# Altium footprint library PowerProducts.PCBLIB: 166 footprints (part 8 of 11)
Each footprint in its own frame and in the unit in brackets; x right, y up, seen from the top. Pads: shape width x height; smd on the part's side, far side on the other; paste and mask are expansions set on the pad; w line width, h text height; cw(c..) or ccw(c..) is an arc to the next point about the centre after c.
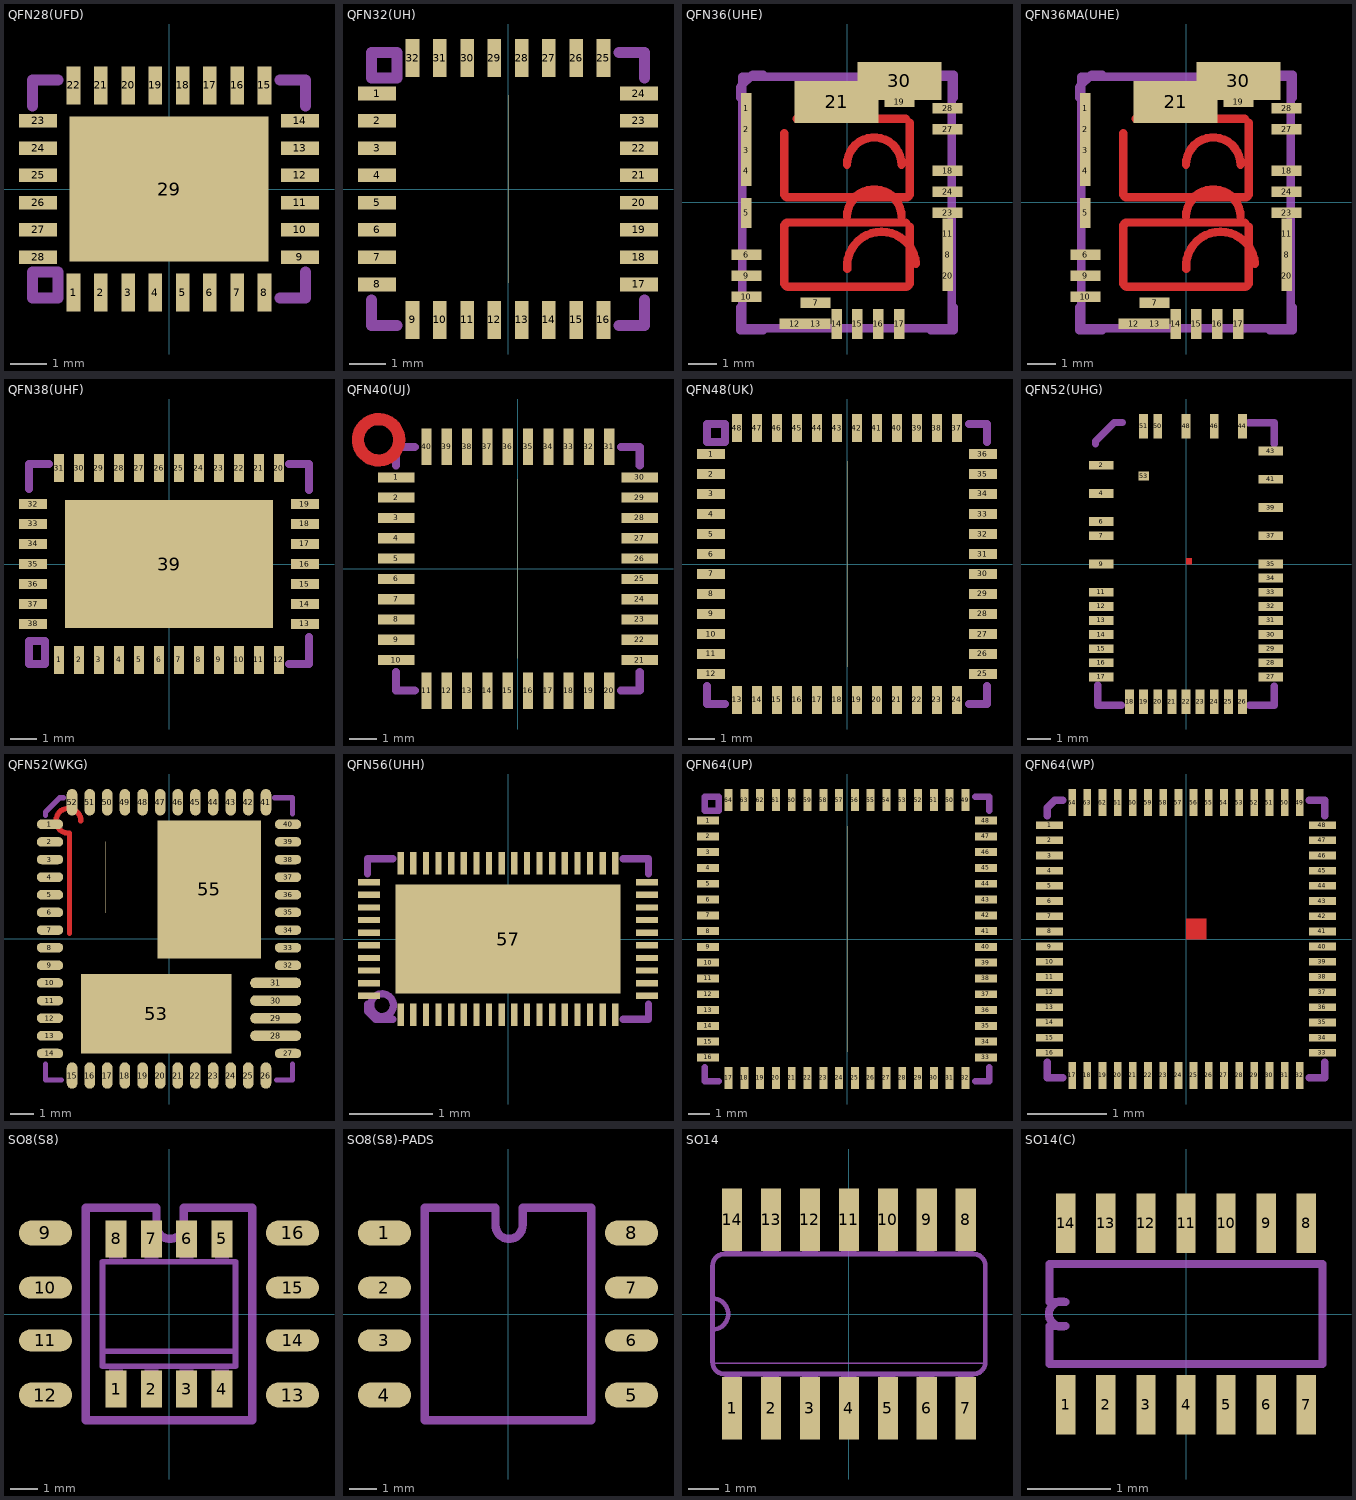
[diagram p7: the footprints below, top view; thin cyan lines are the x and y axes]

## QFN28(UFD) [mil]
pads (29):
  rect 14.76x41.34 smd: 1(-103.35,-112.2) 2(-73.82,-112.2) 3(-44.29,-112.2) 4(-14.76,-112.2) 5(14.76,-112.2) 6(44.29,-112.2) 7(73.82,-112.2) 8(103.35,-112.2) 15(103.35,112.2) 16(73.82,112.2) 17(44.29,112.2) 18(14.76,112.2) 19(-14.76,112.2) 20(-44.29,112.2) 21(-73.82,112.2) 22(-103.35,112.2)
  rect 41.34x14.76 smd: 9(141.73,-73.82) 10(141.73,-44.29) 11(141.73,-14.76) 12(141.73,14.76) 13(141.73,44.29) 14(141.73,73.82) 23(-141.73,73.82) 24(-141.73,44.29) 25(-141.73,14.76) 26(-141.73,-14.76) 27(-141.73,-44.29) 28(-141.73,-73.82)
  rect 215.55x156.5 smd: 29(0,0)
Mechanical 2:
  lines w12: -147.64,90 -147.64,118.11 -120,118.11 ; 120,-118.11 147.64,-118.11 147.64,-90 ; 120,118.11 147.64,118.11 147.64,90 ; -147.64,-118.11 -120,-118.11 -120,-90 -147.64,-90 -147.64,-118.11

## QFN32(UH) [mm]
pads (33):
  rect 1.05x0.375 smd: 1(-3.6,2.625) 2(-3.6,1.875) 3(-3.6,1.125) 4(-3.6,0.375) 5(-3.6,-0.375) 6(-3.6,-1.125) 7(-3.6,-1.875) 8(-3.6,-2.625) 17(3.6,-2.625) 18(3.6,-1.875) 19(3.6,-1.125) 20(3.6,-0.375) 21(3.6,0.375) 22(3.6,1.125) 23(3.6,1.875) 24(3.6,2.625)
  rect 0.375x1.05 smd: 9(-2.625,-3.6) 10(-1.875,-3.6) 11(-1.125,-3.6) 12(-0.375,-3.6) 13(0.375,-3.6) 14(1.125,-3.6) 15(1.875,-3.6) 16(2.625,-3.6) 25(2.625,3.6) 26(1.875,3.6) 27(1.125,3.6) 28(0.375,3.6) 29(-0.375,3.6) 30(-1.125,3.6) 31(-1.875,3.6) 32(-2.625,3.6)
  rect 0x5.175 smd: 33(0,0)
Mechanical 2:
  lines w0.305: -3.75,-3.048 -3.75,-3.75 -3.048,-3.75 ; 3.048,-3.75 3.75,-3.75 3.75,-3.048 ; 3.048,3.75 3.75,3.75 3.75,3.048 ; -3.75,3.048 -3.048,3.048 -3.048,3.75 -3.75,3.75 -3.75,3.048

## QFN36(UHE) [mm]
pads (26):
  rect 0.375x1.08 smd: 1(-3.6,3.375) 2(-3.6,2.625) 3(-3.6,1.875) 4(-3.6,1.125) 5(-3.6,-0.375) 8(3.6,-1.875) 11(3.6,-1.125) 14(-0.375,-4.35) 15(0.375,-4.35) 16(1.125,-4.35) 17(1.875,-4.35) 20(3.6,-2.625)
  rect 1.08x0.375 smd: 6(-3.6,-1.875) 7(-1.125,-3.6) 9(-3.6,-2.625) 10(-3.6,-3.375) 12(-1.875,-4.35) 13(-1.125,-4.35) 18(3.6,1.125) 19(1.875,3.6) 23(3.6,-0.375) 24(3.6,0.375) 27(3.6,2.625) 28(3.6,3.375)
  rect 3x1.5 smd: 21(-0.375,3.6)
  rect 3x1.35 smd: 30(1.875,4.35)
Top Layer:
  lines w0.3: -2.25,2.475 -2.25,0.33 ccw(c-2.1,0.33) -2.1,0.18 2.1,0.18 ccw(c2.1,0.33) 2.25,0.33 2.25,2.85 ; -1.8,3 2.1,3 ; 0,-0.51 cw(c0.975,-0.51) 1.95,-0.51 ; 0,1.351 cw(c0.975,1.351) 1.95,1.351 ; 0.003,-2.383 cw(c1.236,-2.288) 2.47,-2.193 ; 2.1,-0.72 -2.1,-0.72 ccw(c-2.1,-0.87) -2.25,-0.87 -2.25,-2.865 ccw(c-2.1,-2.865) -2.1,-3.015 2.1,-3.015 ccw(c2.1,-2.865) 2.25,-2.865 2.25,-0.87
Top Paste:
  lines w0.15: -2.25,2.475 -2.25,0.33 ccw(c-2.1,0.33) -2.1,0.18 2.1,0.18 ccw(c2.1,0.33) 2.25,0.33 2.25,2.85 ; -1.8,3 2.1,3 ; 0,-0.51 cw(c0.975,-0.51) 1.95,-0.51 ; 0,1.351 cw(c0.975,1.351) 1.95,1.351 ; 0.003,-2.383 cw(c1.236,-2.288) 2.47,-2.193 ; 2.1,-0.72 -2.1,-0.72 ccw(c-2.1,-0.87) -2.25,-0.87 -2.25,-2.865 ccw(c-2.1,-2.865) -2.1,-3.015 2.1,-3.015 ccw(c2.1,-2.865) 2.25,-2.865 2.25,-0.87
Top Solder:
  lines w0.36: -2.25,2.475 -2.25,0.33 ccw(c-2.1,0.33) -2.1,0.18 2.1,0.18 ccw(c2.1,0.33) 2.25,0.33 2.25,2.85 ; -1.8,3 2.1,3 ; 0,-0.51 cw(c0.975,-0.51) 1.95,-0.51 ; 0,1.351 cw(c0.975,1.351) 1.95,1.351 ; 0.003,-2.383 cw(c1.236,-2.288) 2.47,-2.193 ; 2.1,-0.72 -2.1,-0.72 ccw(c-2.1,-0.87) -2.25,-0.87 -2.25,-2.865 ccw(c-2.1,-2.865) -2.1,-3.015 2.1,-3.015 ccw(c2.1,-2.865) 2.25,-2.865 2.25,-0.87
Mechanical 2:
  lines w0.3: -3.825,-3.75 -3.825,-4.575 -3,-4.575 ; -3.825,3.75 -3.825,4.125 -3.375,4.575 -3,4.575 ; 3,-4.575 3.825,-4.575 3.825,-3.75 ; 3,4.575 3.825,4.575 3.825,3.75 ; -3.75,-4.5 3.75,-4.5 3.75,4.5 -3.75,4.5 -3.75,-4.5

## QFN36MA(UHE) [mm]
pads (26):
  rect 0.375x1.08 smd: 1(-3.6,3.375) 2(-3.6,2.625) 3(-3.6,1.875) 4(-3.6,1.125) 5(-3.6,-0.375) 8(3.6,-1.875) 11(3.6,-1.125) 14(-0.375,-4.35) 15(0.375,-4.35) 16(1.125,-4.35) 17(1.875,-4.35) 20(3.6,-2.625)
  rect 1.08x0.375 smd: 6(-3.6,-1.875) 7(-1.125,-3.6) 9(-3.6,-2.625) 10(-3.6,-3.375) 12(-1.875,-4.35) 13(-1.125,-4.35) 18(3.6,1.125) 19(1.875,3.6) 23(3.6,-0.375) 24(3.6,0.375) 27(3.6,2.625) 28(3.6,3.375)
  rect 3x1.5 smd: 21(-0.375,3.6)
  rect 3x1.35 smd: 30(1.875,4.35)
Top Layer:
  lines w0.3: -2.25,2.475 -2.25,0.33 ccw(c-2.1,0.33) -2.1,0.18 2.1,0.18 ccw(c2.1,0.33) 2.25,0.33 2.25,2.85 ; -1.8,3 2.1,3 ; 0,-0.51 cw(c0.975,-0.51) 1.95,-0.51 ; 0,1.351 cw(c0.975,1.351) 1.95,1.351 ; 0.003,-2.383 cw(c1.236,-2.288) 2.47,-2.193 ; 2.1,-0.72 -2.1,-0.72 ccw(c-2.1,-0.87) -2.25,-0.87 -2.25,-2.865 ccw(c-2.1,-2.865) -2.1,-3.015 2.1,-3.015 ccw(c2.1,-2.865) 2.25,-2.865 2.25,-0.87
Top Paste:
  lines w0.15: -2.25,2.475 -2.25,0.33 ccw(c-2.1,0.33) -2.1,0.18 2.1,0.18 ccw(c2.1,0.33) 2.25,0.33 2.25,2.85 ; -1.8,3 2.1,3 ; 0,-0.51 cw(c0.975,-0.51) 1.95,-0.51 ; 0,1.351 cw(c0.975,1.351) 1.95,1.351 ; 0.003,-2.383 cw(c1.236,-2.288) 2.47,-2.193 ; 2.1,-0.72 -2.1,-0.72 ccw(c-2.1,-0.87) -2.25,-0.87 -2.25,-2.865 ccw(c-2.1,-2.865) -2.1,-3.015 2.1,-3.015 ccw(c2.1,-2.865) 2.25,-2.865 2.25,-0.87
Top Solder:
  lines w0.36: -2.25,2.475 -2.25,0.33 ccw(c-2.1,0.33) -2.1,0.18 2.1,0.18 ccw(c2.1,0.33) 2.25,0.33 2.25,2.85 ; -1.8,3 2.1,3 ; 0,-0.51 cw(c0.975,-0.51) 1.95,-0.51 ; 0,1.351 cw(c0.975,1.351) 1.95,1.351 ; 0.003,-2.383 cw(c1.236,-2.288) 2.47,-2.193 ; 2.1,-0.72 -2.1,-0.72 ccw(c-2.1,-0.87) -2.25,-0.87 -2.25,-2.865 ccw(c-2.1,-2.865) -2.1,-3.015 2.1,-3.015 ccw(c2.1,-2.865) 2.25,-2.865 2.25,-0.87
Mechanical 2:
  lines w0.3: -3.825,-3.75 -3.825,-4.575 -3,-4.575 ; -3.825,3.75 -3.825,4.125 -3.375,4.575 -3,4.575 ; 3,-4.575 3.825,-4.575 3.825,-3.75 ; 3,4.575 3.825,4.575 3.825,3.75 ; -3.75,-4.5 3.75,-4.5 3.75,4.5 -3.75,4.5 -3.75,-4.5

## QFN38(UHF) [mil]
pads (39):
  rect 14.76x41.34 smd: 1(-162.4,-141.73) 2(-132.87,-141.73) 3(-103.35,-141.73) 4(-73.82,-141.73) 5(-44.29,-141.73) 6(-14.76,-141.73) 7(14.76,-141.73) 8(44.29,-141.73) 9(73.82,-141.73) 10(103.35,-141.73) 11(132.87,-141.73) 12(162.4,-141.73) 20(162.4,141.73) 21(132.87,141.73) 22(103.35,141.73) 23(73.82,141.73) 24(44.29,141.73) 25(14.76,141.73) 26(-14.76,141.73) 27(-44.29,141.73) 28(-73.82,141.73) 29(-103.35,141.73) 30(-132.87,141.73) 31(-162.4,141.73)
  rect 41.34x14.76 smd: 13(200.79,-88.58) 14(200.79,-59.06) 15(200.79,-29.53) 16(200.79,0) 17(200.79,29.53) 18(200.79,59.06) 19(200.79,88.58) 32(-200.79,88.58) 33(-200.79,59.06) 34(-200.79,29.53) 35(-200.79,0) 36(-200.79,-29.53) 37(-200.79,-59.06) 38(-200.79,-88.58)
  rect 307.09x188.98 smd: 39(0,0)
Mechanical 2:
  lines w12: -206.69,110.73 -206.69,147.64 -177.17,147.64 ; 177.17,-147.64 206.69,-147.64 206.69,-107.78 ; 177.17,147.64 206.69,147.64 206.69,109.25 ; -206.69,-147.64 -183.07,-147.64 -183.07,-113.68 -206.69,-113.68 -206.69,-147.64

## QFN40(UJ) [mm]
pads (41):
  rect 1.35x0.375 smd: 1(-4.5,3.375) 2(-4.5,2.625) 3(-4.5,1.875) 4(-4.5,1.125) 5(-4.5,0.375) 6(-4.5,-0.375) 7(-4.5,-1.125) 8(-4.5,-1.875) 9(-4.5,-2.625) 10(-4.5,-3.375) 21(4.5,-3.375) 22(4.5,-2.625) 23(4.5,-1.875) 24(4.5,-1.125) 25(4.5,-0.375) 26(4.5,0.375) 27(4.5,1.125) 28(4.5,1.875) 29(4.5,2.625) 30(4.5,3.375)
  rect 0.375x1.35 smd: 11(-3.375,-4.5) 12(-2.625,-4.5) 13(-1.875,-4.5) 14(-1.125,-4.5) 15(-0.375,-4.5) 16(0.375,-4.5) 17(1.125,-4.5) 18(1.875,-4.5) 19(2.625,-4.5) 20(3.375,-4.5) 31(3.375,4.5) 32(2.625,4.5) 33(1.875,4.5) 34(1.125,4.5) 35(0.375,4.5) 36(-0.375,4.5) 37(-1.125,4.5) 38(-1.875,4.5) 39(-2.625,4.5) 40(-3.375,4.5)
  rect 0x6.63 smd: 41(0,0)
Top Layer:
  circle w0.45: c-5.143,4.763 r0.762
Mechanical 2:
  lines w0.305: -4.5,-3.81 -4.5,-4.5 -3.81,-4.5 ; -4.5,3.81 -4.5,4.5 -3.81,4.5 ; 3.81,-4.5 4.5,-4.5 4.5,-3.81 ; 3.81,4.5 4.5,4.5 4.5,3.81

## QFN48(UK) [mil]
pads (49):
  rect 41.34x14.76 smd: 1(-200.79,162.4) 2(-200.79,132.87) 3(-200.79,103.35) 4(-200.79,73.82) 5(-200.79,44.29) 6(-200.79,14.76) 7(-200.79,-14.76) 8(-200.79,-44.29) 9(-200.79,-73.82) 10(-200.79,-103.35) 11(-200.79,-132.87) 12(-200.79,-162.4) 25(200.79,-162.4) 26(200.79,-132.87) 27(200.79,-103.35) 28(200.79,-73.82) 29(200.79,-44.29) 30(200.79,-14.76) 31(200.79,14.76) 32(200.79,44.29) 33(200.79,73.82) 34(200.79,103.35) 35(200.79,132.87) 36(200.79,162.4)
  rect 14.76x41.34 smd: 13(-162.4,-200.79) 14(-132.87,-200.79) 15(-103.35,-200.79) 16(-73.82,-200.79) 17(-44.29,-200.79) 18(-14.76,-200.79) 19(14.76,-200.79) 20(44.29,-200.79) 21(73.82,-200.79) 22(103.35,-200.79) 23(132.87,-200.79) 24(162.4,-200.79) 37(162.4,200.79) 38(132.87,200.79) 39(103.35,200.79) 40(73.82,200.79) 41(44.29,200.79) 42(14.76,200.79) 43(-14.76,200.79) 44(-44.29,200.79) 45(-73.82,200.79) 46(-103.35,200.79) 47(-132.87,200.79) 48(-162.4,200.79)
  rect 0x304.13 smd: 49(0,0)
Mechanical 2:
  lines w12: -206.69,-180 -206.69,-206.69 -180,-206.69 ; 180,-206.69 206.69,-206.69 206.69,-180 ; 180,206.69 206.69,206.69 206.69,180 ; -206.69,180 -180,180 -180,206.69 -206.69,206.69 -206.69,180

## QFN52(UHG) [mm]
pads (40):
  rect 1.05x0.375 smd: 2(-3.6,4.2) 4(-3.6,3) 6(-3.6,1.8) 7(-3.6,1.2) 9(-3.6,0) 11(-3.6,-1.2) 12(-3.6,-1.8) 13(-3.6,-2.4) 14(-3.6,-3) 15(-3.6,-3.6) 16(-3.6,-4.2) 17(-3.6,-4.8) 27(3.6,-4.8) 28(3.6,-4.2) 29(3.6,-3.6) 30(3.6,-3) 31(3.6,-2.4) 32(3.6,-1.8) 33(3.6,-1.2) 34(3.6,-0.6) 35(3.6,0) 37(3.6,1.2) 39(3.6,2.4) 41(3.6,3.6) 43(3.6,4.8)
  rect 0.375x1.05 smd: 18(-2.4,-5.85) 19(-1.8,-5.85) 20(-1.2,-5.85) 21(-0.6,-5.85) 22(0,-5.85) 23(0.6,-5.85) 24(1.2,-5.85) 25(1.8,-5.85) 26(2.4,-5.85) 44(2.4,5.85) 46(1.2,5.85) 48(0,5.85) 50(-1.2,5.85) 51(-1.8,5.85)
  rect 0.45x0.375 smd: 53(-1.791,3.734)
Top Layer:
  region: 0,0 0.254,0 0.254,0.254 0,0.254
  region: 0,0 0.254,0 0.254,0.254 0,0.254
  region: 0,0 0.254,0 0.254,0.254 0,0.254
  region: 0,0 0.254,0 0.254,0.254 0,0.254
  region: 0,0 0.254,0 0.254,0.254 0,0.254
  region: 0,0 0.254,0 0.254,0.254 0,0.254
  region: 0,0 0.254,0 0.254,0.254 0,0.254
  region: 0,0 0.254,0 0.254,0.254 0,0.254
  region: 0,0 0.254,0 0.254,0.254 0,0.254
Top Paste:
  region: 0,0 0.254,0 0.254,0.254 0,0.254
  region: 0,0 0.254,0 0.254,0.254 0,0.254
  region: 0,0 0.254,0 0.254,0.254 0,0.254
  region: 0,0 0.254,0 0.254,0.254 0,0.254
  region: 0,0 0.254,0 0.254,0.254 0,0.254
  region: 0,0 0.254,0 0.254,0.254 0,0.254
  region: 0,0 0.254,0 0.254,0.254 0,0.254
  region: 0,0 0.254,0 0.254,0.254 0,0.254
  region: 0,0 0.254,0 0.254,0.254 0,0.254
Top Solder:
  region: 0,0 0.254,0 0.254,0.254 0,0.254
  region: 0,0 0.254,0 0.254,0.254 0,0.254
  region: 0,0 0.254,0 0.254,0.254 0,0.254
  region: 0,0 0.254,0 0.254,0.254 0,0.254
  region: 0,0 0.254,0 0.254,0.254 0,0.254
  region: 0,0 0.254,0 0.254,0.254 0,0.254
  region: 0,0 0.254,0 0.254,0.254 0,0.254
  region: 0,0 0.254,0 0.254,0.254 0,0.254
  region: 0,0 0.254,0 0.254,0.254 0,0.254
Mechanical 2:
  lines w0.305: -3.848,5.105 -3.848,5.22 -3.048,6.02 -2.705,6.02 ; -3.75,-5.143 -3.75,-6 -2.743,-6 ; 2.667,6 3.75,6 3.75,5.105 ; 2.705,-6 3.75,-6 3.75,-5.182

## QFN52(WKG) [mm]
pads (55):
  rrect100% 1.125x0.405 smd: 1(-5.062,4.875) 2(-5.062,4.125) 3(-5.062,3.375) 4(-5.062,2.625) 5(-5.062,1.875) 6(-5.062,1.125) 7(-5.062,0.375) 8(-5.062,-0.375) 9(-5.062,-1.125) 10(-5.062,-1.875) 11(-5.062,-2.625) 12(-5.062,-3.375) 13(-5.062,-4.125) 14(-5.062,-4.875) 27(5.062,-4.875) 32(5.062,-1.125) 33(5.062,-0.375) 34(5.062,0.375) 35(5.062,1.125) 36(5.062,1.875) 37(5.062,2.625) 38(5.062,3.375) 39(5.062,4.125) 40(5.062,4.875)
  rrect100% 0.45x1.125 smd: 15(-4.125,-5.813) 16(-3.375,-5.813) 17(-2.625,-5.813) 18(-1.875,-5.813) 19(-1.125,-5.813) 20(-0.375,-5.813) 21(0.375,-5.813) 22(1.125,-5.813) 23(1.875,-5.813) 24(2.625,-5.813) 25(3.375,-5.813) 26(4.125,-5.813) 41(4.125,5.813) 42(3.375,5.813) 43(2.625,5.813) 44(1.875,5.813) 45(1.125,5.813) 46(0.375,5.813) 47(-0.375,5.813) 48(-1.125,5.813) 49(-1.875,5.813) 50(-2.625,5.813) 51(-3.375,5.813) 52(-4.125,5.813)
  rrect100% 2.175x0.45 smd: 28(4.537,-4.125) 29(4.537,-3.375) 30(4.537,-2.625) 31(4.537,-1.875)
  rect 6.412x3.375 smd: 53(-0.54,-3.18)
  rrect100% 0x3.038 smd: 54(-2.7,2.625)
  rect 4.388x5.85 smd: 55(1.71,2.1)
Top Layer:
  lines w0.225: -4.23,0.225 -4.23,4.5 ; -4.23,4.5 cw(c-4.278,5.026) -3.75,5.025
Top Paste:
  lines w0.113: -4.23,0.225 -4.23,4.5 ; -4.23,4.5 cw(c-4.278,5.026) -3.75,5.025
Top Solder:
  lines w0.27: -4.23,0.225 -4.23,4.5 ; -4.23,4.5 cw(c-4.278,5.026) -3.75,5.025
Mechanical 2:
  lines w0.225: -5.25,-5.325 -5.25,-6 -4.575,-6 ; -5.25,5.25 -5.25,5.4 -4.65,6 -4.5,6 ; 4.5,6 5.25,6 5.25,5.325 ; 4.575,-6 5.25,-6 5.25,-5.325

## QFN56(UHH) [mil]
pads (57):
  rect 3x10.5 smd: 1(-50.97,-36) 2(-44.98,-36) 3(-38.98,-36) 4(-32.98,-36) 5(-26.99,-36) 6(-20.99,-36) 7(-14.99,-36) 8(-9,-36) 9(-3,-36) 10(3,-36) 11(9,-36) 12(14.99,-36) 13(20.99,-36) 14(26.99,-36) 15(32.98,-36) 16(38.98,-36) 17(44.98,-36) 18(50.97,-36) 29(50.97,36) 30(44.98,36) 31(38.98,36) 32(32.98,36) 33(26.99,36) 34(20.99,36) 35(14.99,36) 36(9,36) 37(3,36) 38(-3,36) 39(-9,36) 40(-14.99,36) 41(-20.99,36) 42(-26.99,36) 43(-32.98,36) 44(-38.98,36) 45(-44.98,36) 46(-50.97,36)
  rect 10.5x3 smd: 19(66,-26.99) 20(66,-20.99) 21(66,-14.99) 22(66,-9) 23(66,-3) 24(66,3) 25(66,9) 26(66,14.99) 27(66,20.99) 28(66,26.99) 47(-66,26.99) 48(-66,20.99) 49(-66,14.99) 50(-66,9) 51(-66,3) 52(-66,-3) 53(-66,-9) 54(-66,-14.99) 55(-66,-20.99) 56(-66,-26.99)
  rect 106.95x51.75 smd: 57(0,0)
Mechanical 2:
  circle w3.43: c-59.84,-31.43 r5.39
  lines w3.43: -66.68,-30.96 -66.68,-34.29 -62.87,-38.1 -54.77,-38.1 ; -66.68,30.96 -66.68,38.1 -54.77,38.1 ; 54.77,-38.1 66.68,-38.1 66.68,-30.96 ; 54.77,38.1 66.68,38.1 66.68,30.96

## QFN64(UP) [mil]
pads (65):
  rect 41.34x14.76 smd: 1(-259.84,221.46) 2(-259.84,191.93) 3(-259.84,162.4) 4(-259.84,132.87) 5(-259.84,103.35) 6(-259.84,73.82) 7(-259.84,44.29) 8(-259.84,14.76) 9(-259.84,-14.76) 10(-259.84,-44.29) 11(-259.84,-73.82) 12(-259.84,-103.35) 13(-259.84,-132.87) 14(-259.84,-162.4) 15(-259.84,-191.93) 16(-259.84,-221.46) 33(259.84,-221.46) 34(259.84,-191.93) 35(259.84,-162.4) 36(259.84,-132.87) 37(259.84,-103.35) 38(259.84,-73.82) 39(259.84,-44.29) 40(259.84,-14.76) 41(259.84,14.76) 42(259.84,44.29) 43(259.84,73.82) 44(259.84,103.35) 45(259.84,132.87) 46(259.84,162.4) 47(259.84,191.93) 48(259.84,221.46)
  rect 14.76x41.34 smd: 17(-221.46,-259.84) 18(-191.93,-259.84) 19(-162.4,-259.84) 20(-132.87,-259.84) 21(-103.35,-259.84) 22(-73.82,-259.84) 23(-44.29,-259.84) 24(-14.76,-259.84) 25(14.76,-259.84) 26(44.29,-259.84) 27(73.82,-259.84) 28(103.35,-259.84) 29(132.87,-259.84) 30(162.4,-259.84) 31(191.93,-259.84) 32(221.46,-259.84) 49(221.46,259.84) 50(191.93,259.84) 51(162.4,259.84) 52(132.87,259.84) 53(103.35,259.84) 54(73.82,259.84) 55(44.29,259.84) 56(14.76,259.84) 57(-14.76,259.84) 58(-44.29,259.84) 59(-73.82,259.84) 60(-103.35,259.84) 61(-132.87,259.84) 62(-162.4,259.84) 63(-191.93,259.84) 64(-221.46,259.84)
  rect 0x422.24 smd: 65(0,0)
Mechanical 2:
  lines w12: -265.75,-240 -265.75,-265.75 -240,-265.75 ; 240,-265.75 265.75,-265.75 265.75,-240 ; 240,265.75 265.75,265.75 265.75,240 ; -265.75,240 -240,240 -240,265.75 -265.75,265.75 -265.75,240

## QFN64(WP) [mil]
pads (64):
  rect 13.34x3.81 smd: 1(-67.44,56.25) 2(-67.44,48.75) 3(-67.44,41.25) 4(-67.44,33.75) 5(-67.44,26.25) 6(-67.44,18.75) 7(-67.44,11.25) 8(-67.44,3.75) 9(-67.44,-3.75) 10(-67.44,-11.25) 11(-67.44,-18.75) 12(-67.44,-26.25) 13(-67.44,-33.75) 14(-67.44,-41.25) 15(-67.44,-48.75) 16(-67.44,-56.25) 33(67.44,-56.25) 34(67.44,-48.75) 35(67.44,-41.25) 36(67.44,-33.75) 37(67.44,-26.25) 38(67.44,-18.75) 39(67.44,-11.25) 40(67.44,-3.75) 41(67.44,3.75) 42(67.44,11.25) 43(67.44,18.75) 44(67.44,26.25) 45(67.44,33.75) 46(67.44,41.25) 47(67.44,48.75) 48(67.44,56.25)
  rect 3.81x13.34 smd: 17(-56.25,-67.44) 18(-48.75,-67.44) 19(-41.25,-67.44) 20(-33.75,-67.44) 21(-26.25,-67.44) 22(-18.75,-67.44) 23(-11.25,-67.44) 24(-3.75,-67.44) 25(3.75,-67.44) 26(11.25,-67.44) 27(18.75,-67.44) 28(26.25,-67.44) 29(33.75,-67.44) 30(41.25,-67.44) 31(48.75,-67.44) 32(56.25,-67.44) 49(56.25,67.44) 50(48.75,67.44) 51(41.25,67.44) 52(33.75,67.44) 53(26.25,67.44) 54(18.75,67.44) 55(11.25,67.44) 56(3.75,67.44) 57(-3.75,67.44) 58(-11.25,67.44) 59(-18.75,67.44) 60(-26.25,67.44) 61(-33.75,67.44) 62(-41.25,67.44) 63(-48.75,67.44) 64(-56.25,67.44)
Top Layer:
  region: 0,0 10,0 10,10 0,10
  region: 0,0 10,0 10,10 0,10
  region: 0,0 10,0 10,10 0,10
  region: 0,0 10,0 10,10 0,10
  region: 0,0 10,0 10,10 0,10
  region: 0,0 10,0 10,10 0,10
Top Paste:
  region: 0,0 10,0 10,10 0,10
  region: 0,0 10,0 10,10 0,10
  region: 0,0 10,0 10,10 0,10
  region: 0,0 10,0 10,10 0,10
  region: 0,0 10,0 10,10 0,10
  region: 0,0 10,0 10,10 0,10
Top Solder:
  region: 0,0 10,0 10,10 0,10
  region: 0,0 10,0 10,10 0,10
  region: 0,0 10,0 10,10 0,10
  region: 0,0 10,0 10,10 0,10
  region: 0,0 10,0 10,10 0,10
  region: 0,0 10,0 10,10 0,10
Mechanical 2:
  lines w3.81: -68.58,-60.96 -68.58,-68.58 -60.96,-68.58 ; -68.58,60.96 -68.58,64.77 -64.77,68.58 -60.96,68.58 ; 60.96,-68.58 68.58,-68.58 68.58,-60.96 ; 60.96,68.58 68.58,68.58 68.58,60.96

## SO8(S8) [mil]
pads (16):
  rect 30x52 smd: 1(-75,-106.33) 2(-25,-106.33) 3(25,-106.33) 4(75,-106.33) 5(75,106.33) 6(25,106.33) 7(-25,106.33) 8(-75,106.33)
  rrect100% 75x35.43 smd: 9(-175.01,114.86) 12(-175.01,-114.86) 13(175.01,-114.86) 16(175.01,114.86)
  rrect100% 75x30.71 smd: 10(-175.01,37.5) 11(-175.01,-37.5) 14(175.01,-37.5) 15(175.01,37.5)
Mechanical 2:
  lines w11.81: 20.67,126.32 cw(c1.48,125.62) -17.71,126.36 -17.72,150.59 -118.11,150.59 -118.11,-150.59 118.11,-150.59 118.11,150.59 20.67,150.59 20.67,126.34
Mechanical 18:
  rectangle: -84.84,-122.5 -65.16,-78.5
  rectangle: -34.84,-122.5 -15.16,-78.5
  rectangle: 15.16,-122.5 34.84,-78.5
  rectangle: 65.16,-122.5 84.84,-78.5
  rectangle: 65.16,78.5 84.84,122.5
  rectangle: 15.16,78.5 34.84,122.5
  rectangle: -34.84,78.5 -15.16,122.5
  rectangle: -84.84,78.5 -65.16,122.5
  lines w8: -94.29,-52.56 -94.29,-74.21 94.29,-74.21 94.29,-52.56 ; -94.29,-52.56 -94.29,74.21 94.29,74.21 94.29,-52.56 ; -94.29,-52.56 94.29,-52.56

## SO8(S8)-PADS [mil]
pads (8):
  rrect100% 75x35.43 smd: 1(-175.01,114.86) 4(-175.01,-114.86) 5(175.01,-114.86) 8(175.01,114.86)
  rrect100% 75x30.71 smd: 2(-175.01,37.5) 3(-175.01,-37.5) 6(175.01,-37.5) 7(175.01,37.5)
Mechanical 2:
  lines w11.81: 20.67,126.32 cw(c1.48,125.62) -17.71,126.36 -17.72,150.59 -118.11,150.59 -118.11,-150.59 118.11,-150.59 118.11,150.59 20.67,150.59 20.67,126.34

## SO14 [mil]
pads (14):
  rect 26x80 smd: 1(-150,-121) 2(-100,-121) 3(-50,-121) 4(0,-121) 5(50,-121) 6(100,-121) 7(150,-121) 8(150,121) 9(100,121) 10(50,121) 11(0,121) 12(-50,121) 13(-100,121) 14(-150,121)
Mechanical 2:
  lines w2: -175,-63 175,-63
  lines w6: -160,-77 cw(c-160,-62) -175,-62 -175,-20 ; -160,77 ccw(c-160,62) -175,62 -175,20 ; 160,-77 ccw(c160,-62) 175,-62 175,62 ccw(c160,62) 160,77 ; -175,-20 -175,20 ; -175,-20 ccw(c-175,0) -175,20
Mechanical 18:
  rectangle: -10,77 10,122
  rectangle: -160,-122 -140,-77
  rectangle: -110,-122 -90,-77
  rectangle: -60,-121 -40,-76
  rectangle: -10,-122 10,-77
  rectangle: -60,77 -40,122
  rectangle: -110,77 -90,122
  rectangle: -160,77 -140,122
  rectangle: 40,77 60,122
  rectangle: 90,77 110,122
  rectangle: 140,77 160,122
  rectangle: 40,-122 60,-77
  rectangle: 90,-122 110,-77
  rectangle: 140,-122 160,-77
  lines w6: -160,-77 160,-77 ; -160,77 160,77

## SO14(C) [mil]
pads (14):
  rect 9.14x28.19 smd: 1(-57.15,-43.05) 2(-38.1,-43.05) 3(-19.05,-43.05) 4(0,-43.05) 5(19.05,-43.05) 6(38.1,-43.05) 7(57.15,-43.05) 8(57.15,43.05) 9(38.1,43.05) 10(19.05,43.05) 11(0,43.05) 12(-19.05,43.05) 13(-38.1,43.05) 14(-57.15,43.05)
Mechanical 2:
  lines w3.81: -64.77,-23.81 64.77,-23.81 64.77,23.81 -64.77,23.81 -64.77,5.72 -57.15,5.72 ccw(c-59.05,0) -57.15,-5.71 -64.77,-5.72 -64.77,-23.81